# Altium schematic symbol library AD_Lib.SchLib: 1239 symbols (part 3 of 9)
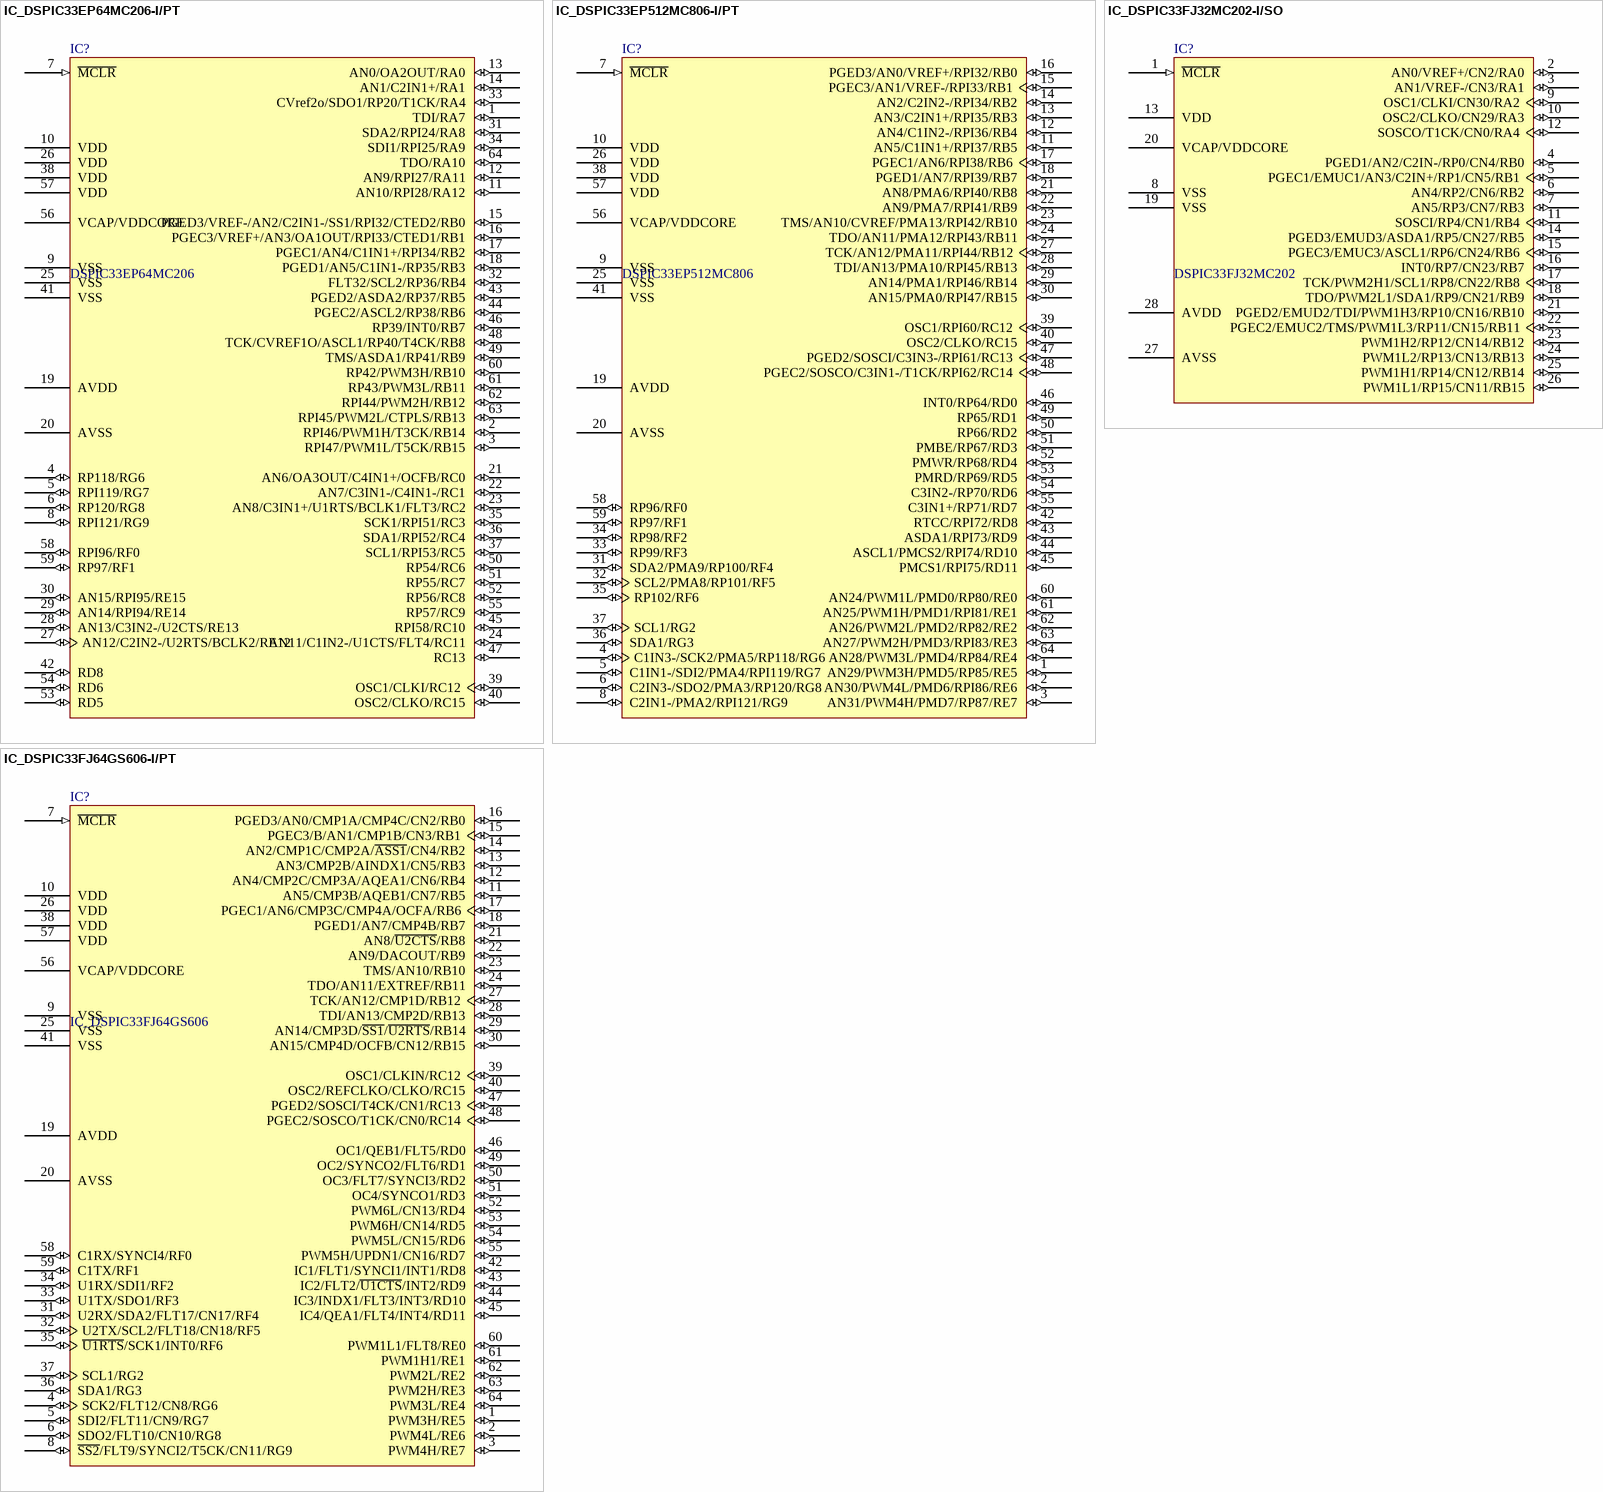
[diagram p44: symbols IC_DSPIC33EP64MC206-I/PT to IC_DSPIC33FJ64GS606-I/PT]

## IC_DSPIC33FJ64GS606-I/PT
designator IC?, comment IC_DSPIC33FJ64GS606
16bit MCU;40MHz;64 KB Flash, 9KB RAM; Manufacturer: Microchip; pro-environment: RoHS; Quality: -40~85¡æ; OPN: IC_DSPIC33FJ64GS606-I/PT; PadsNum: 0; SN: SN; Value: 16bit MCU;40MHz;64 KB Flash, 9 KB RAM; Category: ¼¯³ÉÐ¾Æ¬; Part: IC_DSPIC33FJ64GS606; QTY: 47; Price: ?; OPN_JLC: OPN_JLC; SN_JLC: SN_JLC; Price_JLC: 0
footprint TQFP-64 (Thin QFP, 64-Leads, Body 10x10mm, Pitch 0.5mm, IPC Low Density)
pins: 1 PWM3H/RE5 (io), 2 PWM4L/RE6 (io), 3 PWM4H/RE7 (io), 4 SCK2/FLT12/CN8/RG6 (io), 5 SDI2/FLT11/CN9/RG7 (io), 6 SDO2/FLT10/CN10/RG8 (io), 7 ~{MCLR} (in), 8 ~{SS2}/FLT9/SYNCI2/T5CK/CN11/RG9 (io), 9 VSS (power), 10 VDD (power), 11 AN5/CMP3B/AQEB1/CN7/RB5 (io), 12 AN4/CMP2C/CMP3A/AQEA1/CN6/RB4 (io), 13 AN3/CMP2B/AINDX1/CN5/RB3 (io), 14 AN2/CMP1C/CMP2A/~{ASS1}/CN4/RB2 (io), 15 PGEC3/B/AN1/CMP1B/CN3/RB1 (io), 16 PGED3/AN0/CMP1A/CMP4C/CN2/RB0 (io), 17 PGEC1/AN6/CMP3C/CMP4A/OCFA/RB6 (io), 18 PGED1/AN7/CMP4B/RB7 (io), 19 AVDD (power), 20 AVSS (power), 21 AN8/~{U2CTS}/RB8 (io), 22 AN9/DACOUT/RB9 (io), 23 TMS/AN10/RB10 (io), 24 TDO/AN11/EXTREF/RB11 (io), 25 VSS (power), 26 VDD (power), 27 TCK/AN12/CMP1D/RB12 (io), 28 TDI/AN13/CMP2D/RB13 (io), 29 AN14/CMP3D/~{SS1}/~{U2RTS}/RB14 (io), 30 AN15/CMP4D/OCFB/CN12/RB15 (io), 31 U2RX/SDA2/FLT17/CN17/RF4 (io), 32 U2TX/SCL2/FLT18/CN18/RF5 (io), 33 U1TX/SDO1/RF3 (io), 34 U1RX/SDI1/RF2 (io), 35 ~{U1RTS}/SCK1/INT0/RF6 (io), 36 SDA1/RG3 (io), 37 SCL1/RG2 (io), 38 VDD (power), 39 OSC1/CLKIN/RC12 (io), 40 OSC2/REFCLKO/CLKO/RC15 (io), 41 VSS (power), 42 IC1/FLT1/SYNCI1/INT1/RD8 (io), 43 IC2/FLT2/~{U1CTS}/INT2/RD9 (io), 44 IC3/INDX1/FLT3/INT3/RD10 (io), 45 IC4/QEA1/FLT4/INT4/RD11 (io), 46 OC1/QEB1/FLT5/RD0 (io), 47 PGED2/SOSCI/T4CK/CN1/RC13 (io), 48 PGEC2/SOSCO/T1CK/CN0/RC14 (io), 49 OC2/SYNCO2/FLT6/RD1 (io), 50 OC3/FLT7/SYNCI3/RD2 (io), 51 OC4/SYNCO1/RD3 (io), 52 PWM6L/CN13/RD4 (io), 53 PWM6H/CN14/RD5 (io), 54 PWM5L/CN15/RD6 (io), 55 PWM5H/UPDN1/CN16/RD7 (io), 56 VCAP/VDDCORE (power), 57 VDD (power), 58 C1RX/SYNCI4/RF0 (io), 59 C1TX/RF1 (io), 60 PWM1L1/FLT8/RE0 (io), 61 PWM1H1/RE1 (io), 62 PWM2L/RE2 (io), 63 PWM2H/RE3 (io), 64 PWM3L/RE4 (io)

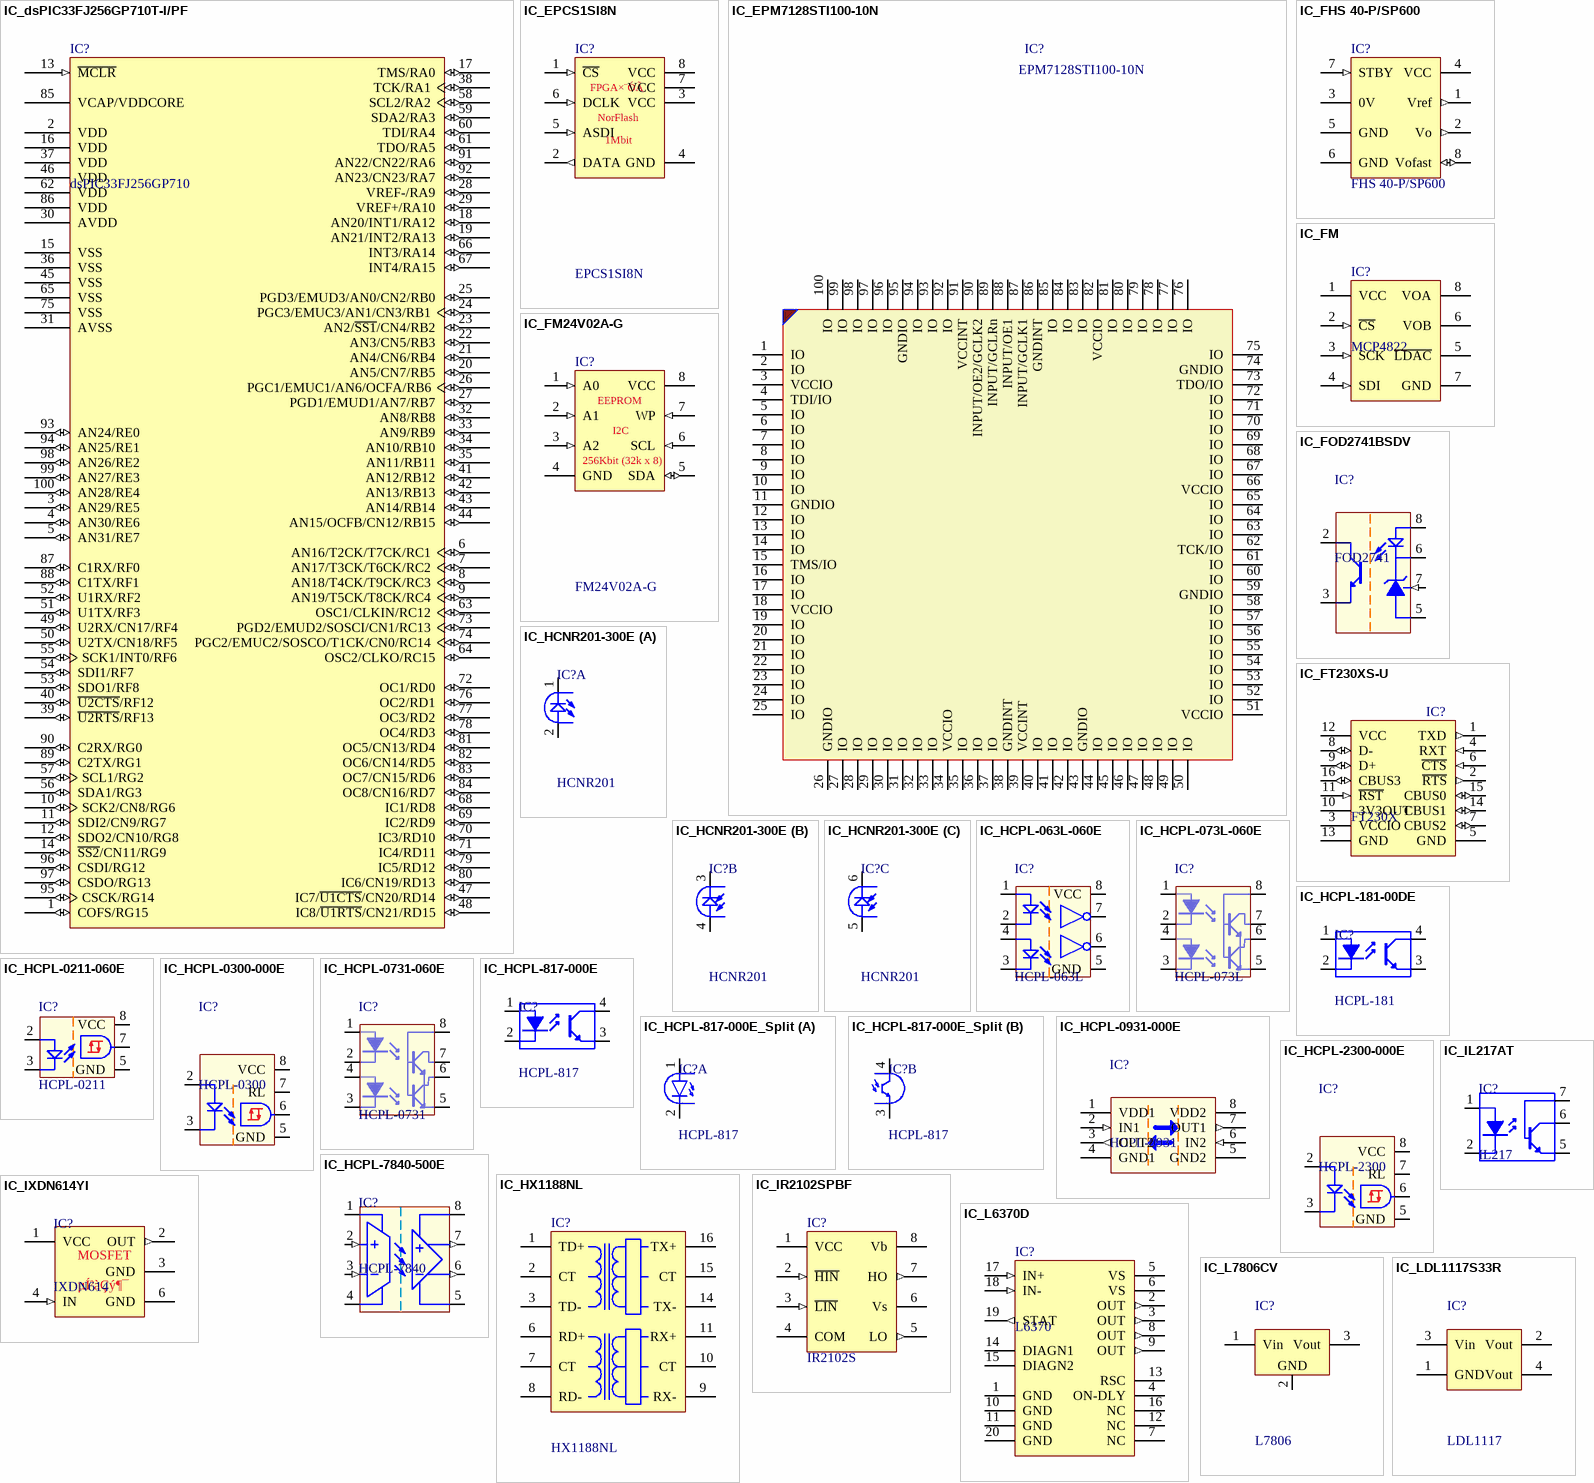
[diagram p10: symbols IC_dsPIC33FJ256GP710T-I/PF to IC_LDL1117S33R]

## IC_dsPIC33FJ256GP710T-I/PF
designator IC?, comment dsPIC33FJ256GP710
MCU,16bit,40MHz; Manufacturer: Microchip; Quality: -40~85¡æ; Value: 16bit;40MHz;3V~3.6V; pro-environment: RoHS; OPN: dsPIC33FJ256GP710-I/PF; PadsNum: 0; SN: SN; Category: ¼¯³ÉÐ¾Æ¬; Part: dsPIC33FJ256GP710; QTY: 90; Price: ?; OPN_JLC: OPN_JLC; SN_JLC: SN_JLC; Price_JLC: 0
footprint TQFP-100_W (100-Pin Thin Quad Flat Pack 0.5 mm Pitch, IPC Low Density)
pins: 1 COFS/RG15 (io), 2 VDD (power), 3 AN29/RE5 (io), 4 AN30/RE6 (io), 5 AN31/RE7 (io), 6 AN16/T2CK/T7CK/RC1 (io), 7 AN17/T3CK/T6CK/RC2 (io), 8 AN18/T4CK/T9CK/RC3 (io), 9 AN19/T5CK/T8CK/RC4 (io), 10 SCK2/CN8/RG6 (io), 11 SDI2/CN9/RG7 (io), 12 SDO2/CN10/RG8 (io), 13 ~{MCLR} (in), 14 ~{SS2}/CN11/RG9 (io), 15 VSS (power), 16 VDD (power), 17 TMS/RA0 (io), 18 AN20/INT1/RA12 (io), 19 AN21/INT2/RA13 (io), 20 AN5/CN7/RB5 (io), 21 AN4/CN6/RB4 (io), 22 AN3/CN5/RB3 (io), 23 AN2/~{SS1}/CN4/RB2 (io), 24 PGC3/EMUC3/AN1/CN3/RB1 (io), 25 PGD3/EMUD3/AN0/CN2/RB0 (io), 26 PGC1/EMUC1/AN6/OCFA/RB6 (io), 27 PGD1/EMUD1/AN7/RB7 (io), 28 VREF-/RA9 (io), 29 VREF+/RA10 (io), 30 AVDD (power), 31 AVSS (power), 32 AN8/RB8 (io), 33 AN9/RB9 (io), 34 AN10/RB10 (io), 35 AN11/RB11 (io), 36 VSS (power), 37 VDD (power), 38 TCK/RA1 (io), 39 ~{U2RTS}/RF13 (io), 40 ~{U2CTS}/RF12 (io), 41 AN12/RB12 (io), 42 AN13/RB13 (io), 43 AN14/RB14 (io), 44 AN15/OCFB/CN12/RB15 (io), 45 VSS (power), 46 VDD (power), 47 IC7/~{U1CTS}/CN20/RD14 (io), 48 IC8/~{U1RTS}/CN21/RD15 (io), 49 U2RX/CN17/RF4 (io), 50 U2TX/CN18/RF5 (io), 51 U1TX/RF3 (io), 52 U1RX/RF2 (io), 53 SDO1/RF8 (io), 54 SDI1/RF7 (io), 55 SCK1/INT0/RF6 (io), 56 SDA1/RG3 (io), 57 SCL1/RG2 (io), 58 SCL2/RA2 (io), 59 SDA2/RA3 (io), 60 TDI/RA4 (io), 61 TDO/RA5 (io), 62 VDD (power), 63 OSC1/CLKIN/RC12 (io), 64 OSC2/CLKO/RC15 (io), 65 VSS (power), 66 INT3/RA14 (io), 67 INT4/RA15 (io), 68 IC1/RD8 (io), 69 IC2/RD9 (io), 70 IC3/RD10 (io), 71 IC4/RD11 (io), 72 OC1/RD0 (io), 73 PGD2/EMUD2/SOSCI/CN1/RC13 (io), 74 PGC2/EMUC2/SOSCO/T1CK/CN0/RC14 (io), 75 VSS (power), 76 OC2/RD1 (io), 77 OC3/RD2 (io), 78 OC4/RD3 (io), 79 IC5/RD12 (io), 80 IC6/CN19/RD13 (io), 81 OC5/CN13/RD4 (io), 82 OC6/CN14/RD5 (io), 83 OC7/CN15/RD6 (io), 84 OC8/CN16/RD7 (io), 85 VCAP/VDDCORE (power), 86 VDD (power), 87 C1RX/RF0 (io), 88 C1TX/RF1 (io), 89 C2TX/RG1 (io), 90 C2RX/RG0 (io), 91 AN22/CN22/RA6 (io), 92 AN23/CN23/RA7 (io), 93 AN24/RE0 (io), 94 AN25/RE1 (io), 95 CSCK/RG14 (io), 96 CSDI/RG12 (io), 97 CSDO/RG13 (io), 98 AN26/RE2 (io), 99 AN27/RE3 (io), 100 AN28/RE4 (io)

## IC_EPCS1SI8N
designator IC?, comment EPCS1SI8N
NOR Flash,1Mb,FPGA×¨ÓÃ; Manufacturer: Altera; pro-environment: RoHS; Quality: -40~85¡æ; SN: 03.4.11.16.84S1SI01S; Value: 1Mb,3.3V; PadsNum: 0; Category: ¼¯³ÉÐ¾Æ¬; OPN: EPCS1SI8N; Part: EPCS1SI8N; QTY: 100; Price: 32; OPN_JLC: OPN_JLC; SN_JLC: SN_JLC; Price_JLC: 0
footprint SO-8 (SOIC, 8-Leads, Body 4.9x3.9mm, Pitch 1.27mm, IPC Low Density)
pins: 1 ~{CS} (in), 2 DATA (out), 3 VCC (power), 4 GND (power), 5 ASDI (in), 6 DCLK (in), 7 VCC (power), 8 VCC (power)
text: FPGA×¨ÓÃ; NorFlash; 1Mbit

## IC_EPM7128STI100-10N
designator IC?, comment EPM7128STI100-10N
CPLD,3~3.6V; Manufacturer: Altera; Other: CPLD;3~3.6V;84 I/O;8 LAB; pro-environment: RoHS; Quality: -40~85¡æ; Value: 20MHz,3.3V; SN: 03.4.11.27.71712801S; PadsNum: 0; OPN: EPM7128STI100-10N; Part: EPM7128STI100-10N; QTY: 90; Price: 534.5613; OPN_JLC: OPN_JLC; SN_JLC: SN_JLC; Price_JLC: 0
footprint TQFP-100_W (100-Pin Thin Quad Flat Pack 0.5 mm Pitch, IPC Low Density)
pins: 1 IO, 2 IO, 3 VCCIO, 4 TDI/IO, 5 IO, 6 IO, 7 IO, 8 IO, 9 IO, 10 IO, 11 GNDIO, 12 IO, 13 IO, 14 IO, 15 TMS/IO, 16 IO, 17 IO, 18 VCCIO, 19 IO, 20 IO, 21 IO, 22 IO, 23 IO, 24 IO, 25 IO, 26 GNDIO, 27 IO, 28 IO, 29 IO, 30 IO, 31 IO, 32 IO, 33 IO, 34 VCCIO, 35 IO, 36 IO, 37 IO, 38 GNDINT, 39 VCCINT, 40 IO, 41 IO, 42 IO, 43 GNDIO, 44 IO, 45 IO, 46 IO, 47 IO, 48 IO, 49 IO, 50 IO, 51 VCCIO, 52 IO, 53 IO, 54 IO, 55 IO, 56 IO, 57 IO, 58 IO, 59 GNDIO, 60 IO, 61 IO, 62 TCK/IO, 63 IO, 64 IO, 65 IO, 66 VCCIO, 67 IO, 68 IO, 69 IO, 70 IO, 71 IO, 72 IO, 73 TDO/IO, 74 GNDIO, 75 IO, 76 IO, 77 IO, 78 IO, 79 IO, 80 IO, 81 IO, 82 VCCIO, 83 IO, 84 IO, 85 IO, 86 GNDINT, 87 INPUT/GCLK1, 88 INPUT/OE1, 89 INPUT/GCLRn, 90 INPUT/OE2/GCLK2, 91 VCCINT, 92 IO, 93 IO, 94 IO, 95 GNDIO, 96 IO, 97 IO, 98 IO, 99 IO, 100 IO

## IC_FHS 40-P/SP600
designator IC?, comment FHS 40-P/SP600
µçÁ÷´«¸ÐÆ÷; 0-100A; 5V; Manufacturer: LEM; Quality: -40~125¡æ; Value: 100A,5V; pro-environment: RoHS; SN: 03.4.11.22.83FHS401S; other: 200mV/A; PadsNum: 0; Category: ¼¯³ÉÐ¾Æ¬; OPN: FHS 40-P/SP600; Part: FHS 40-P/SP600; QTY: 75; Price: ?; OPN_JLC: OPN_JLC; SN_JLC: SN_JLC; Price_JLC: 0
footprint SO-8 (SOIC, 8-Leads, Body 4.9x3.9mm, Pitch 1.27mm, IPC Low Density)
pins: 1 Vref (out), 2 Vo (out), 3 0V, 4 VCC (power), 5 GND (power), 6 GND (power), 7 STBY (in), 8 Vofast (io)

## IC_FM
designator IC?, comment MCP4822
DAC; SPI; 12bit; 2Í¨µÀ; 2.7V~5.5V; Manufacturer: Microchip; pro-environment: RoHS; Quality: -40~125¡æ; OPN: MCP4822-E/SN; other: ÄÚ²¿²Î¿¼Ô´; PadsNum: 8; SN: SN; Category: ¼¯³ÉÐ¾Æ¬; Part: MCP4822; QTY: 100; Price: 18.3738; OPN_JLC: MCP4822-E/SN; SN_JLC: C16040; Price_JLC: 11.11
footprint SO-8 (SOIC, 8-Leads, Body 4.9x3.9mm, Pitch 1.27mm, IPC Low Density)
pins: 1 VCC (power), 2 ~{CS} (in), 3 SCK (in), 4 SDI (in), 5 ~{LDAC}, 6 VOB, 7 GND (power), 8 VOA

## IC_FM24V02A-G
designator IC?, comment FM24V02A-G
256Kbit (32kx8) EEPROM, F-RAM;2.0~3.6V;I2C; Manufacturer: Cypress; pro-environment: RoHS; Quality: -40~85°C; PadsNum: 0; SN: SN; Value: 2.0~3.6V; Category: F-RAM; OPN: FM24V02A-G; Part: FM24V02A-G; other: 256Kbit (32kx8) EEPROM, F-RAM;2.0~3.6V;I2C; OPN_JLC: OPN_JLC; SN_JLC: SN_JLC; Price_JLC: 0
footprint SO-8 (SOIC, 8-Leads, Body 4.9x3.9mm, Pitch 1.27mm, IPC Low Density)
pins: 1 A0 (in), 2 A1 (in), 3 A2 (in), 4 GND (power), 5 SDA (io), 6 SCL (in), 7 WP (in), 8 VCC (power)
text: EEPROM; I2C; 256Kbit (32k x 8)

## IC_FOD2741BSDV
designator IC?, comment FOD2741
¹âñî;Vce=30V;If=20mA; Manufacturer: ON; Quality: -40~85¡æ; pro-environment: RoHS; Value: Vce=30V;If=20mA;5kV; OPN: FOD2741BSDV; PadsNum: 0; SN: SN; Category: ¼¯³ÉÐ¾Æ¬; Part: FOD2741; QTY: 1000; Price: 4.914; OPN_JLC: OPN_JLC; SN_JLC: SN_JLC; Price_JLC: 0
footprint DIP-8 (DIP; 8 Leads; Row Spacing 7.62 mm; Pitch 2.54 mm)
pins: 2 C, 3 E, 5 GND (power), 6 COMP (oc), 7 FB (in), 8 LED

## IC_FT230XS-U
designator IC?, comment FT230X
USB<->UART;2.97~5.5V;12Mb/s; Manufacturer: FTDI; Value: 2.97V~5.5V,12Mb/s; Quality: -40~125¡æ; pro-environment: RoHS; OPN: FT230XS-U; PadsNum: 0; other: USB<->UART;2.97~5.5V;12Mb/s; SN: SN; Category: ¼¯³ÉÐ¾Æ¬; Part: FT230X; QTY: 100; Price: 14.9872; OPN_JLC: OPN_JLC; SN_JLC: SN_JLC; Price_JLC: 0
footprint IC_FT23XS-U (SOP, 16-Leads, Body 4.90x3.91mm, Pitch 0.635mm)
pins: 1 TXD (out), 2 ~{RTS} (out), 3 VCCIO (power), 4 RXT (in), 5 GND (power), 6 ~{CTS} (in), 7 CBUS2 (io), 8 D- (io), 9 D+ (io), 10 3V3OUT (power), 11 ~{RST} (in), 12 VCC (power), 13 GND (power), 14 CBUS1 (io), 15 CBUS0 (io), 16 CBUS3 (io)

## IC_HCNR201-300E
designator IC?, comment HCNR201
ÏßÐÔ¹âñî; Manufacturer: Avago; pro-environment: RoHS; Quality: -55~100¡æ; SN: 03.4.23.11.47R20101S; Value: ¡À5%; OPN: HCNR201-300E; other: 1-20mA;5%; PadsNum: 0; Category: ¼¯³ÉÐ¾Æ¬; Part: HCNR201; QTY: 42; Price: ?; OPN_JLC: OPN_JLC; SN_JLC: SN_JLC; Price_JLC: 0
footprint DIP8_SMD (ÌùÆ¬¸ßËÙ¹âñî£¨ÈçHCPL-2300£©)
part A pins: 1, 2
part B pins: 3, 4
part C pins: 5, 6

## IC_HCPL-063L-060E
designator IC?, comment HCPL-063L
¹âñî£¬¸ßËÙ£¬µÍµ¼Í¨µçÁ÷; Manufacturer: Avago; pro-environment: RoHS; Quality: -40~85¡æ; Value: 10Mbps; OPN: HCPL-063L-060E; other: If=5mA;VDD=3.3/5V; PadsNum: 0; SN: SN; Category: ¼¯³ÉÐ¾Æ¬; Part: HCPL-063L; QTY: 100; Price: ?; OPN_JLC: OPN_JLC; SN_JLC: SN_JLC; Price_JLC: 0
footprint SO-8 (SOIC, 8-Leads, Body 4.9x3.9mm, Pitch 1.27mm, IPC Low Density)
pins: 1 A1, 2 C1, 3 C2, 4 A2, 5 GND (power), 6 Vo2, 7 Vo1, 8 VCC (power)

## IC_HCPL-073L-060E
designator IC?, comment HCPL-073L
¹âñî;100 kbps;0.5mA; Manufacturer: Avago; pro-environment: RoHS; Quality: 0~70¡æ; SN: 03.4.23.11.83073L01S; OPN: HCPL-073L-060E; other: If=0.5mA;VDD=3.3V/5V; PadsNum: 0; Value: 100 kbps; Category: ¼¯³ÉÐ¾Æ¬; Part: HCPL-073L; QTY: 100; Price: 22.5693; OPN_JLC: OPN_JLC; SN_JLC: SN_JLC; Price_JLC: 0
footprint SO-8 (SOIC, 8-Leads, Body 4.9x3.9mm, Pitch 1.27mm, IPC Low Density)
pins: 1 A "Anode", 2 K "Cathode", 3 K "Cathode", 4 A "Anode", 5 E "Emitter", 6 C2 "Emitter", 7 C1 "Collector", 8 VCC "Collector"

## IC_HCPL-181-00DE
designator IC?, comment HCPL-181
¹âñî; 80V; 50mA; 18us/18us; Manufacturer: Avago; pro-environment: RoHS; Quality: -55~100¡æ; SN: 03.4.23.11.47L18101S; Value: 25kbps; OPN: HCPL-181-00DE; PadsNum: 0; Category: ¼¯³ÉÐ¾Æ¬; Part: HCPL-181; QTY: 3000; Price: 1.2753; OPN_JLC: OPN_JLC; SN_JLC: SN_JLC; Price_JLC: 0
footprint SO-4W (Pitch=100mil£¬ÈçHCPL-181)
pins: 1 A "Anode", 2 K "Cathode", 3 E "Emitter", 4 C "Collector"

## IC_HCPL-0211-060E
designator IC?, comment HCPL-0211
¹âñî£¬¸ßËÙ; Manufacturer: Avago; Quality: -40~80¡æ; pro-environment: RoHS; Value: 5 Mbps; OPN: HCPL-0211-060E; PadsNum: 0; SN: SN; Category: ¼¯³ÉÐ¾Æ¬; Part: HCPL-0211; QTY: 100; Price: ?; OPN_JLC: OPN_JLC; SN_JLC: SN_JLC; Price_JLC: 0
footprint SO-8 (SOIC, 8-Leads, Body 4.9x3.9mm, Pitch 1.27mm, IPC Low Density)
pins: 2 A, 3 C, 5 GND (power), 7 Vo1, 8 VCC (power)

## IC_HCPL-0300-000E
designator IC?, comment HCPL-0300
¹âñî;5Mbps; Manufacturer: Avago; Quality: -40~80¡æ; pro-environment: RoHS; OPN: HCPL-0300-000E; PadsNum: 0; Value: 5 Mbps; SN: SN; Category: ¼¯³ÉÐ¾Æ¬; Part: HCPL-0300; QTY: 50; Price: 37.3464; OPN_JLC: OPN_JLC; SN_JLC: SN_JLC; Price_JLC: 0
footprint SO-8 (SOIC, 8-Leads, Body 4.9x3.9mm, Pitch 1.27mm, IPC Low Density)
pins: 2 A, 3 C, 5 GND (power), 6  Vout (oc), 7 RL, 8 VCC (power)

## IC_HCPL-0731-060E
designator IC?, comment HCPL-0731
¹âñî;100kbps;0.5mA; Manufacturer: Avago; pro-environment: RoHS; Quality: 0~70¡æ; SN: 03.4.23.11.47073101S; OPN: HCPL-0731-060E; other: If=0.5mA;VDD=5V; PadsNum: 0; Value: 100 kbps; Category: ¼¯³ÉÐ¾Æ¬; Part: HCPL-0731; QTY: 100; Price: ?; OPN_JLC: OPN_JLC; SN_JLC: SN_JLC; Price_JLC: 0
footprint SO-8 (SOIC, 8-Leads, Body 4.9x3.9mm, Pitch 1.27mm, IPC Low Density)
pins: 1 A "Anode", 2 K "Cathode", 3 K "Cathode", 4 A "Anode", 5 E "Emitter", 6 C2 "Emitter", 7 C1 "Collector", 8 VCC "Collector"

## IC_HCPL-817-000E
designator IC?, comment HCPL-817
¹âñî; Manufacturer: Avago; pro-environment: RoHS; Quality: -30~100¡æ; Value: 25kbps; OPN: HCPL-817-000E; PadsNum: 0; SN: SN; Category: ¼¯³ÉÐ¾Æ¬; Part: HCPL-817; QTY: 100; Price: 1.521; OPN_JLC: OPN_JLC; SN_JLC: SN_JLC; Price_JLC: 0
footprint DIP-4 (DIP; 4 Leads; Row Spacing 7.62 mm; Pitch 2.54 mm)
pins: 1 A "Anode", 2 K "Cathode", 3 E "Emitter", 4 C "Collector"

## IC_HCPL-817-000E_Split
designator IC?, comment HCPL-817
¹âñî; ·ÖÀëÐÍ; Manufacturer: Avago; pro-environment: RoHS; Quality: -30~100¡æ; Value: 25kbps; OPN: HCPL-817-000E; PadsNum: 0; SN: SN; Category: ¼¯³ÉÐ¾Æ¬; Part: HCPL-817; QTY: 100; Price: 1.521; OPN_JLC: OPN_JLC; SN_JLC: SN_JLC; Price_JLC: 0
footprint DIP-4 (DIP; 4 Leads; Row Spacing 7.62 mm; Pitch 2.54 mm)
part A pins: 1 A "Anode", 2 K "Cathode"
part B pins: 3 E "Emitter", 4 C "Collector"

## IC_HCPL-0931-000E
designator IC?, comment HCPL-0931
Êý×Ö¸ôÀëÆ÷,1In1Out,2.7~5.5V; Manufacturer: Avago; Quality: -40~80¡æ; pro-environment: RoHS; Value: 100MBd; SN: 03.4.23.11.83093101S; OPN: HCPL-0931-000E; PadsNum: 0; Category: ¼¯³ÉÐ¾Æ¬; Part: HCPL-0931; QTY: 100; Price: 34.2693; OPN_JLC: OPN_JLC; SN_JLC: SN_JLC; Price_JLC: 0
footprint SO-8 (SOIC, 8-Leads, Body 4.9x3.9mm, Pitch 1.27mm, IPC Low Density)
pins: 1 VDD1 (power), 2 IN1 (in), 3 OUT2 (out), 4 GND1, 5 GND2 (power), 6 IN2 (in), 7 OUT1 (out), 8 VDD2 (power)

## IC_HCPL-2300-000E
designator IC?, comment HCPL-2300
¹âñî;5Mbps; Manufacturer: Avago; Quality: -40~80¡æ; pro-environment: RoHS; SN: 03.4.23.11.83230001S; OPN: HCPL-2300-000E; PadsNum: 0; Value: 5 Mbps; Category: ¼¯³ÉÐ¾Æ¬; Part: HCPL-2300; QTY: 50; Price: 37.3464; OPN_JLC: OPN_JLC; SN_JLC: SN_JLC; Price_JLC: 0
footprint DIP-8 (DIP; 8 Leads; Row Spacing 7.62 mm; Pitch 2.54 mm)
pins: 2 A, 3 C, 5 GND (power), 6  Vout (oc), 7 RL, 8 VCC (power)

## IC_HCPL-7840-500E
designator IC?, comment HCPL-7840
¸ôÀëÔË·Å£¬BW=100kHz; Manufacturer: Avago; pro-environment: RoHS; Quality: -30~100¡æ; SN: 03.4.23.11.47784001S; OPN: HCPL-7840-500E; other: 4.5V~5.5V;Gain=8 V/V; PadsNum: 0; Value: BW=100kHz; Category: ¼¯³ÉÐ¾Æ¬; Part: HCPL-7840; QTY: 1000; Price: 26.9568; OPN_JLC: OPN_JLC; SN_JLC: SN_JLC; Price_JLC: 0
footprint DIP8_SMD (ÌùÆ¬¸ßËÙ¹âñî£¨ÈçHCPL-2300£©)
pins: 1 VDD1 (power), 2 + (in), 3 - (in), 4 GND1 (power), 5 GND2 (power), 6 - (out), 7 + (out), 8 VDD2

## IC_HX1188NL
designator IC?, comment HX1188NL
ÒÔÌ«Íø¸ôÀë±äÑ¹Æ÷; Manufacturer: Pulse; pro-environment: RoHS; Quality: -40~85¡æ; SN: 03.4.11.25.47118801S; Value: 10kHz~100MHz; other: 1.5kV,10kHz~100MHz; PadsNum: 0; Category: ¼¯³ÉÐ¾Æ¬; OPN: HX1188NL; Part: HX1188NL; QTY: 40; Price: ?; OPN_JLC: OPN_JLC; SN_JLC: SN_JLC; Price_JLC: 0
footprint HX1188NL (SOP, 16-Leads, Body 12.7x7.1mm (max), Pitch 1.2)
pins: 1 TD+, 2 CT, 3 TD-, 6 RD+, 7 CT, 8 RD-, 9 RX-, 10 CT, 11 RX+, 14 TX-, 15 CT, 16 TX+

## IC_IL217AT
designator IC?, comment IL217
¹âñî; Manufacturer: Vishay; pro-environment: RoHS; Quality: -55~100¡æ; Value: 3us/3us; OPN: IL217AT; PadsNum: 0; SN: SN; Category: ¼¯³ÉÐ¾Æ¬; Part: IL217; QTY: 2000; Price: 2.6091; OPN_JLC: OPN_JLC; SN_JLC: SN_JLC; Price_JLC: 0
footprint SO-8 (SOIC, 8-Leads, Body 4.9x3.9mm, Pitch 1.27mm, IPC Low Density)
pins: 1 A "Anode", 2 K "Cathode", 5 E "Emitter", 6 C "Collector", 7 B "Collector"

## IC_IR2102SPBF
designator IC?, comment IR2102S
MOSFETÇý¶¯; Manufacturer: IR; Quality: -40~125¡æ; Value: 130mA,10~20V; pro-environment: RoHS; SN: 03.4.11.20.84210201S; OPN: IR2102SPBF; PadsNum: 0; Category: ¼¯³ÉÐ¾Æ¬; Part: IR2102S; QTY: 95; Price: ?; OPN_JLC: OPN_JLC; SN_JLC: SN_JLC; Price_JLC: 0
footprint SO-8 (SOIC, 8-Leads, Body 4.9x3.9mm, Pitch 1.27mm, IPC Low Density)
pins: 1 VCC (power), 2 ~{HIN} (in), 3 ~{LIN} (in), 4 COM (power), 5 LO (out), 6 Vs, 7 HO (out), 8 Vb (power)

## IC_IXDN614YI
designator IC?, comment IXDN614
MOSFETÇý¶¯;1CH;4.5~35V;µÍ²à; Manufacturer: IXYS; pro-environment: RoHS; Quality: -40~80¡æ; SN: 03.4.24.21.63N61401S; OPN: IXDN614YI; Value: 4.5~35V;Low-Side; PadsNum: 0; part: IXDN614; QTY: 50; Price: 34.281; Category: ¼¯³ÉÐ¾Æ¬; OPN_JLC: OPN_JLC; SN_JLC: SN_JLC; Price_JLC: 0
footprint SO-8 (SOIC, 8-Leads, Body 4.9x3.9mm, Pitch 1.27mm, IPC Low Density)
pins: 1 VCC (power), 2 OUT (out), 3 GND (power), 4 IN (in), 6 GND (power)
text: MOSFET; µÍ²àÇý¶¯

## IC_L6370D
designator IC?, comment L6370
IPS,HS,4CH,2.5A,9.5~35V; Manufacturer: ST; pro-environment: RoHS; Quality: -25~85¡æ; SN: 03.4.11.20.84L67301S; OPN: L6370D; PadsNum: 0; Value: 2.5A,9.5~35V; Category: ¼¯³ÉÐ¾Æ¬; Part: L6370; QTY: 31; Price: 47.8647; OPN_JLC: OPN_JLC; SN_JLC: SN_JLC; Price_JLC: 0
footprint PowerSO-20 (20-Pin Small Outline Package 1.27 mm Pitch, IPC High Density)
pins: 1 GND (power), 2 OUT (out), 3 OUT (out), 4 ON-DLY, 5 VS (power), 6 VS (power), 7 NC, 8 OUT (out), 9 OUT (out), 10 GND (power), 11 GND (power), 12 NC, 13 RSC, 14 DIAGN1 (oc), 15 DIAGN2 (oc), 16 NC, 17 IN+ (in), 18 IN- (in), 19 STAT (out), 20 GND (power)

## IC_L7806CV
designator IC?, comment L7806
ÎÈÑ¹Ð¾Æ¬; LDO; 35V; 6V/1.5A; Manufacturer: ST; pro-environment: RoHS; Quality: 0~125¡æ; Value: 6V,1.5A; OPN: L7806CV; PadsNum: 3; SN: SN; Category: ¼¯³ÉÐ¾Æ¬; Part: L7806; QTY: 50; Price: 4.1019; OPN_JLC: L7806CV; SN_JLC: C181037; Price_JLC: 1.1859
footprint TO220-3 (TO, Thru-Hole, Vertical, Heatsink Mounted; 3 In-Line Leads; Pitch 2.54 mm)
pins: 0 GND (power), 1 Vin, 2 GND (power), 3 Vout

## IC_LDL1117S33R
designator IC?, comment LDL1117
LDO; 1.2A; 0.35V@1.2A; 87dB@120Hz; Manufacturer: ST; pro-environment: RoHS; Quality: -40~125¡æ; Value: 3.3V,1.2A; OPN: LDL1117S33R; PadsNum: 4; SN: SN; Category: ¼¯³ÉÐ¾Æ¬; Part: LDL1117; QTY: 2500; Price: 2.1809; OPN_JLC: LDL1117S33R; SN_JLC: C435835; Price_JLC: 1.1177
footprint SOT223-4 (SOT223, 4-Leads, Body 6.5x3.5mm, Pitch 2.3mm, Lead Span 7mm, IPC Low Density)
pins: 1 GND, 2 Vout, 3 Vin, 4 Vout

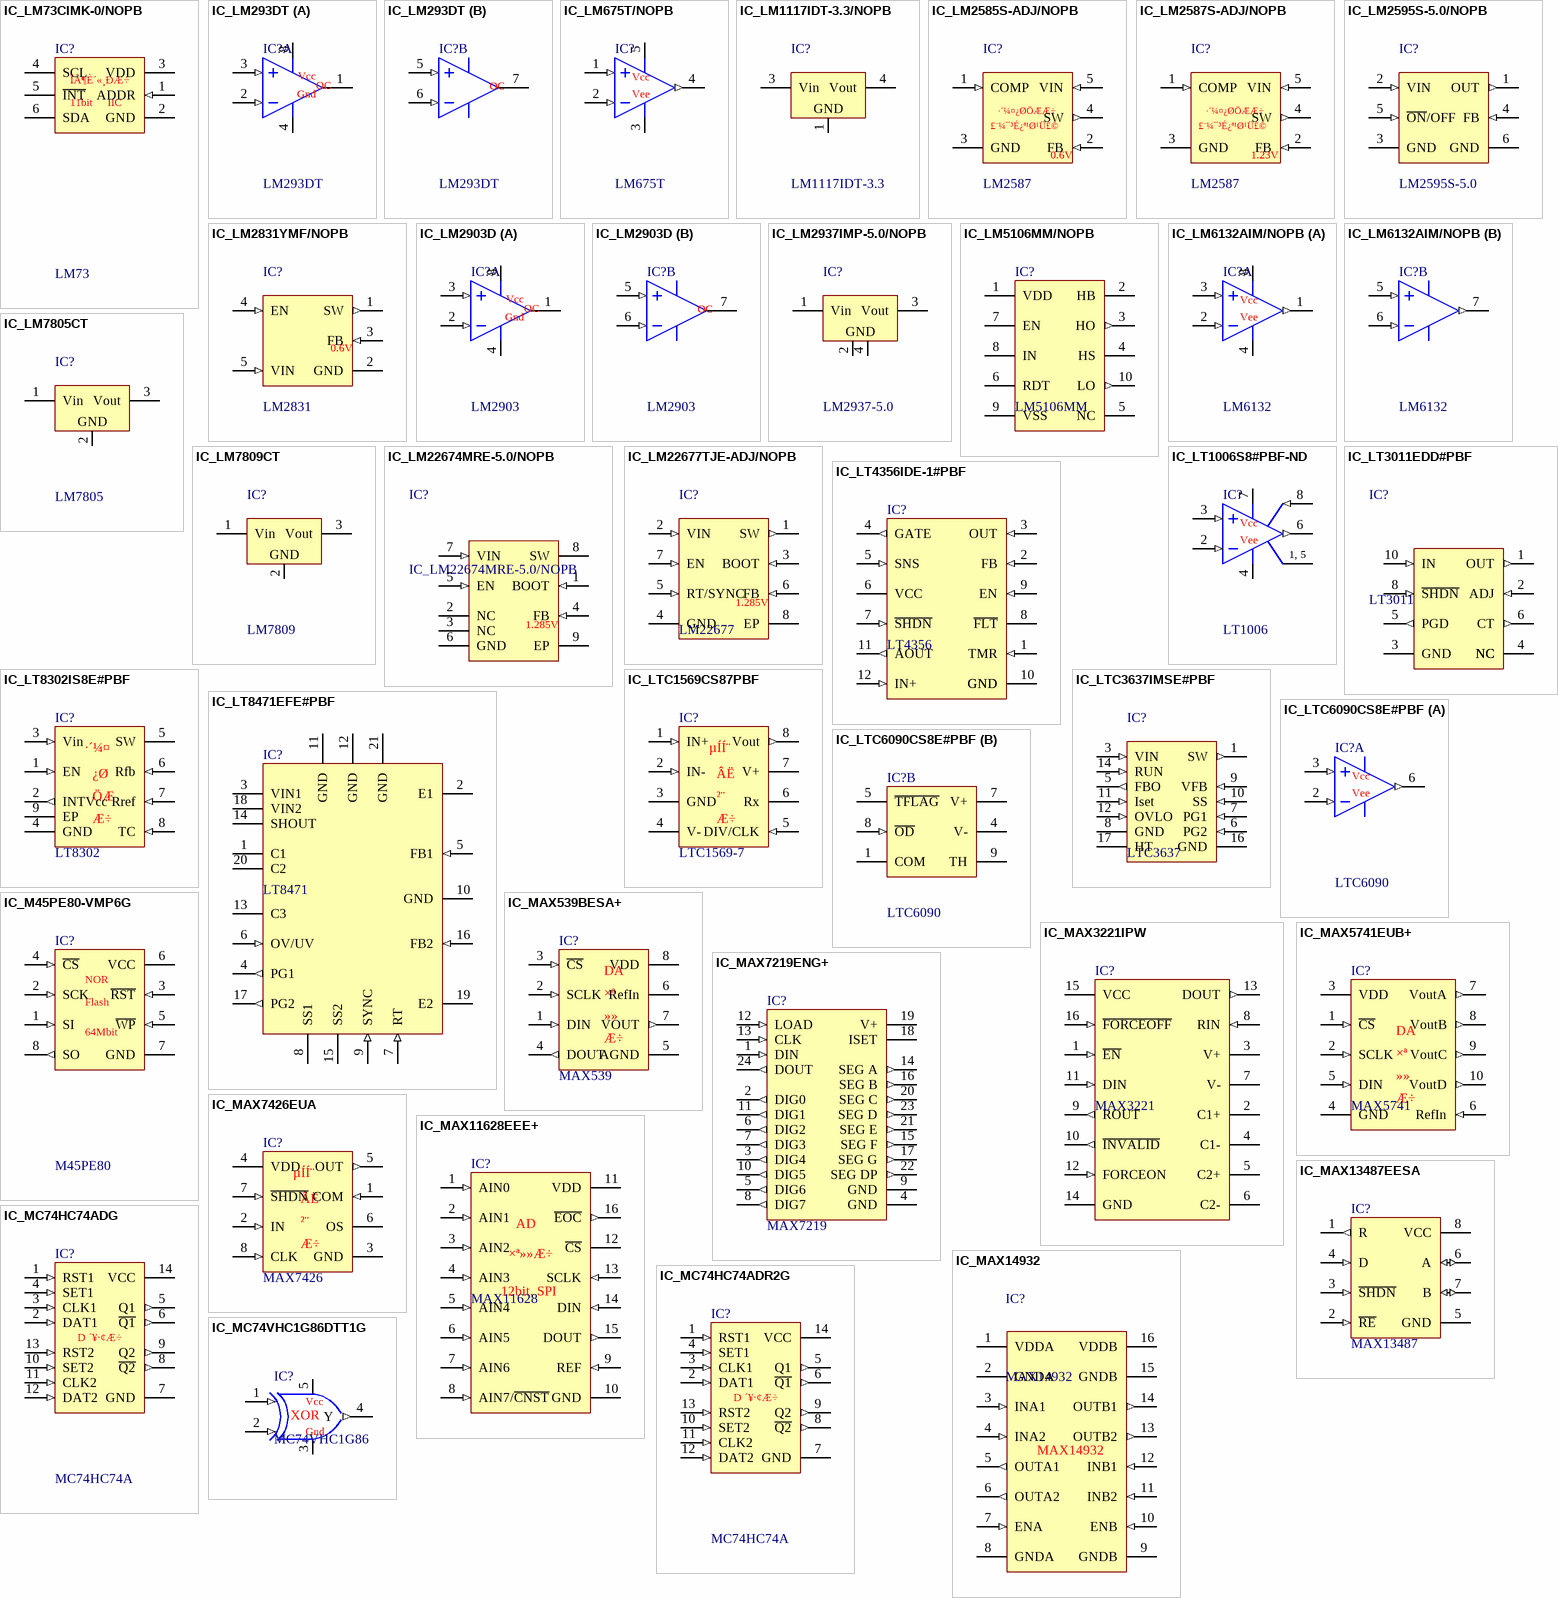
[diagram p11: symbols IC_LM73CIMK-0/NOPB to IC_MC74VHC1G86DTT1G]

## IC_LM73CIMK-0/NOPB
designator IC?, comment LM73
ÎÂ¶È´«¸ÐÆ÷; 11~14bit; 2.7~5.5V; I2C;¡À2C; Manufacturer: TI; pro-environment: RoHS; Quality: -40~150¡æ; Value: 11~14bit,2.7~5.5V,IIC; OPN: LM73CIMK-0/NOPB; other: ÎÂ¶È´«¸ÐÆ÷; 11~14bit; 2.7~5.5V; I2C;;¡À2C; PadsNum: 0; SN: SN; Category: ¼¯³ÉÐ¾Æ¬; Part: LM73; QTY: 1000; Price: 7.8068; OPN_JLC: OPN_JLC; SN_JLC: SN_JLC; Price_JLC: 0
footprint SOT23-6 (SOT23, 6-Leads, Body 2.9x1.6mm, Pitch 0.95mm, Lead Span 2.7mm, IPC Low Density)
pins: 1 ADDR (in), 2 GND (power), 3 VDD (power), 4 SCL (oc), 5 ~{INT} (oc), 6 SDA (oc)
text: ÎÂ¶È´«¸ÐÆ÷; 11bit; IIC

## IC_LM293DT
designator IC?, comment LM293DT
±È½ÏÆ÷; 2P; Io=4mA; Manufacturer: ST; Quality: -40~105¡æ; Value: 2V~36V;; pro-environment: RoHS; SN: 03.4.11.15.83M29301S; other: Io=4mA;Êä³ö¼¶=OC; PadsNum: 0; Category: ¼¯³ÉÐ¾Æ¬; OPN: LM293DT; Part: LM293DT; QTY: 2500; Price: 0.73944; OPN_JLC: OPN_JLC; SN_JLC: SN_JLC; Price_JLC: 0
footprint SO-8 (SOIC, 8-Leads, Body 4.9x3.9mm, Pitch 1.27mm, IPC Low Density)
part A pins: 1 OUT (oc), 2 IN- (in), 3 IN+ (in), 4 GND (power), 8 VCC (power)
part B pins: 5 IN+ (in), 6 IN- (in), 7 OUT (oc)
part A text: Vcc; OC; Gnd
part B text: OC

## IC_LM675T/NOPB
designator IC?, comment LM675T
¹¦ÂÊÔË·Å; Io=3A; 16~60V; Manufacturer: TI; Quality: -40~85¡æ; Value: 3A;16V~60V;; pro-environment: RoHS; other: Io=3A;SR=8V/us; OPN: LM675T/NOPB; PadsNum: 0; SN: SN; Category: ¼¯³ÉÐ¾Æ¬; Part: LM675T; QTY: 45; Price: 41.2074; OPN_JLC: OPN_JLC; SN_JLC: SN_JLC; Price_JLC: 0
footprint TO220-5B_HT (TO, Thru-Hole, Vertical, Heatsink Mounted; 5 Bent Staggered Leads; Pitch 1.7 mm)
pins: 1 IN+ (in), 2 IN- (in), 3 VEE (power), 4 OUTA (out), 5 VCC (power)
text: Vcc; Vee

## IC_LM1117IDT-3.3/NOPB
designator IC?, comment LM1117IDT-3.3
ÎÈÑ¹Ð¾Æ¬,LDO,3.3V/1.5A; Manufacturer: TI; pro-environment: RoHS; Quality: -40~125¡æ; Value: 3.3V,1.5A; OPN: LM1117IDT-3.3/NOPB; PadsNum: 0; SN: SN; Category: ¼¯³ÉÐ¾Æ¬; Part: LM1117IDT-3.3; QTY: 75; Price: 8.1666; OPN_JLC: OPN_JLC; SN_JLC: SN_JLC; Price_JLC: 0
footprint TO252-3 (D-PAK, 4-Leads, Body 6.1x6.5mm, Pitch 2.28mm, Lead Span 9.8mm, IPC Low Density)
pins: 1 GND (power), 3 Vin, 4 Vout

## IC_LM2585S-ADJ/NOPB
designator IC?, comment LM2587
ÎÈÑ¹Ð¾Æ¬; ¿ª¹ØÐÍ; Êä³öµçÁ÷3A; Manufacturer: TI; pro-environment: RoHS; Quality: -40~125¡æ; Value: ADJ,3A; OPN: LM2587S-ADJ/NOPB; other: Vin=4V~40V,Vout>=1.23 V;Iout=3A; PadsNum: 0; SN: SN; Category: ¼¯³ÉÐ¾Æ¬; Part: LM2587; QTY: 45; Price: 72.9144; OPN_JLC: OPN_JLC; SN_JLC: SN_JLC; Price_JLC: 0
footprint TO263-5 (LM2576ÏµÁÐÌùÆ¬Ôª¼þ£¬NSÄÚ²¿±àºÅTS5B)
pins: 1 COMP (in), 2 FB (in), 3 GND (power), 4 SW (out), 5 VIN (in)
text: ·´¼¤¿ØÖÆÆ÷; £¨¼¯³É¿ª¹Ø¹Ü£©; 0.6V

## IC_LM2587S-ADJ/NOPB
designator IC?, comment LM2587
ÎÈÑ¹Ð¾Æ¬; ¿ª¹ØÐÍ; Êä³öµçÁ÷5A; Manufacturer: TI; pro-environment: RoHS; Quality: -40~125¡æ; SN: 03.4.11.13.63258701S; Value: ADJ,5A; OPN: LM2587S-ADJ/NOPB; other: Vin=4V~40V,Vout>=1.23 V;Iout=5A; PadsNum: 0; Category: ¼¯³ÉÐ¾Æ¬; Part: LM2587; QTY: 45; Price: 72.9144; OPN_JLC: OPN_JLC; SN_JLC: SN_JLC; Price_JLC: 0
footprint TO263-5 (LM2576ÏµÁÐÌùÆ¬Ôª¼þ£¬NSÄÚ²¿±àºÅTS5B)
pins: 1 COMP (in), 2 FB (in), 3 GND (power), 4 SW (out), 5 VIN (in), 6 PAD (power)
text: ·´¼¤¿ØÖÆÆ÷; £¨¼¯³É¿ª¹Ø¹Ü£©; 1.23V

## IC_LM2595S-5.0/NOPB
designator IC?, comment LM2595S-5.0
ÎÈÑ¹Ð¾Æ¬; ¿ª¹ØÐÍ; 4.5V~40V,5 V/1A; Manufacturer: TI; pro-environment: RoHS; Quality: -40~85¡æ; SN: 03.4.11.13.63259501S; Value: 40V,1A; OPN: LM2595S-5.0/NOPB; other: Vin=4.5V~40V,Vout=5 V;Iout=1A; PadsNum: 0; Category: ¼¯³ÉÐ¾Æ¬; Part: LM2595S-5.0; QTY: 45; Price: 31.0401; OPN_JLC: OPN_JLC; SN_JLC: SN_JLC; Price_JLC: 0
footprint TO263-5 (LM2576ÏµÁÐÌùÆ¬Ôª¼þ£¬NSÄÚ²¿±àºÅTS5B)
pins: 1 OUT (out), 2 VIN (in), 3 GND (power), 4 FB (in), 5 ~{ON}/OFF (in), 6 GND (power)

## IC_LM2831YMF/NOPB
designator IC?, comment LM2831
ÎÈÑ¹Ð¾Æ¬; ¿ª¹ØÐÍ; Êä³öµçÁ÷1.5A; Manufacturer: TI; pro-environment: RoHS; Quality: -40~125¡æ; SN: 03.4.11.13.49283101S; Value: 5V,1.5A; OPN: LM2831YMF/NOPB; other: Vin=3.3V~5V,Vout>=0.6 V;Iout=1.5A; PadsNum: 0; Category: ¼¯³ÉÐ¾Æ¬; Part: LM2831; QTY: 1000; Price: 7.0434; OPN_JLC: OPN_JLC; SN_JLC: SN_JLC; Price_JLC: 0
footprint SOT23-5 (SOT23, 5-Leads, Body 2.9x1.6mm, Pitch 0.95mm, Lead Span 2.7mm, IPC Low Density)
pins: 1 SW (out), 2 GND (power), 3 FB (in), 4 EN (in), 5 VIN (in)
text: 0.6V

## IC_LM2903D
designator IC?, comment LM2903
±È½ÏÆ÷£¬2P£¬Io=7mA£¬OC; Manufacturer: TI; Quality: -40~125¡æ; Value: 2V~30V;OC; pro-environment: RoHS; SN: 03.4.11.15.83290301S; other: Io=7mA;Tr=300ns; OPN: LM2903D; PadsNum: 0; Category: ¼¯³ÉÐ¾Æ¬; Part: LM2903; QTY: 75; Price: 1.3689; OPN_JLC: OPN_JLC; SN_JLC: SN_JLC; Price_JLC: 0
footprint SO-8 (SOIC, 8-Leads, Body 4.9x3.9mm, Pitch 1.27mm, IPC Low Density)
part A pins: 1 OUT (oc), 2 IN- (in), 3 IN+ (in), 4 GND (power), 8 VCC (power)
part B pins: 5 IN+ (in), 6 IN- (in), 7 OUT (oc)
part A text: Vcc; OC; Gnd
part B text: OC

## IC_LM2937IMP-5.0/NOPB
designator IC?, comment LM2937-5.0
ÎÈÑ¹Ð¾Æ¬,LDO,5.0V/0.5A; Manufacturer: TI; pro-environment: RoHS; Quality: -40~125¡æ; SN: 03.4.11.13.57IM5001S; Value: 5.0V,0.5A; OPN: LM2937IMP-5.0/NOPB; PadsNum: 0; Category: ¼¯³ÉÐ¾Æ¬; Part: LM2937-5.0; QTY: 1000; Price: 7.02; OPN_JLC: OPN_JLC; SN_JLC: SN_JLC; Price_JLC: 0
footprint SOT223-4 (SOT223, 4-Leads, Body 6.5x3.5mm, Pitch 2.3mm, Lead Span 7mm, IPC Low Density)
pins: 1 Vin, 2 GND (power), 3 Vout, 4 GND (power)

## IC_LM5106MM/NOPB
designator IC?, comment LM5106MM
MOSFETÇý¶¯; 1.8A; 8~14V; °ëÇÅÇý¶¯; Manufacturer: IR; Quality: -40~125¡æ; Value: 1.8A,8~14V; pro-environment: RoHS; SN: 03.4.11.20.84210201S; OPN: LM5106MM/NOPB; PadsNum: 0; Category: ¼¯³ÉÐ¾Æ¬; Part: LM5106MM; QTY: 1000; Price: 6.0021; OPN_JLC: OPN_JLC; SN_JLC: SN_JLC; Price_JLC: 0
footprint SO-8 (SOIC, 8-Leads, Body 4.9x3.9mm, Pitch 1.27mm, IPC Low Density)
pins: 1 VDD (power), 2 HB, 3 HO (out), 4 HS, 5 NC, 6 RDT, 7 EN (power), 8 IN (power), 9 VSS (power), 10 LO (out)

## IC_LM6132AIM/NOPB
designator IC?, comment LM6132
OPA; 2P; Io=4mA; Manufacturer: TI; Quality: -40~85¡æ; Value: 1.8V~24V;; pro-environment: RoHS; SN: 03.4.11.15.84613201S; other: Io=4mA;SR=14V/us; OPN: LM6132AIM/NOPB; PadsNum: 0; Category: ¼¯³ÉÐ¾Æ¬; Part: LM6132; QTY: 98; Price: ?; OPN_JLC: OPN_JLC; SN_JLC: SN_JLC; Price_JLC: 0
footprint SO-8 (SOIC, 8-Leads, Body 4.9x3.9mm, Pitch 1.27mm, IPC Low Density)
part A pins: 1 OUTA (out), 2 INA- (in), 3 INA+ (in), 4 VEE (power), 8 VCC (power)
part B pins: 5 INB+ (in), 6 INB- (in), 7 OUTB (out)
part A text: Vcc; Vee

## IC_LM7805CT
designator IC?, comment LM7805
ÎÈÑ¹Ð¾Æ¬, LDO, Êä³öµçÁ÷1A; Manufacturer: ON; pro-environment: RoHS; Quality: 0~70¡æ; Value: 5V,1A; OPN: LM7805CT; PadsNum: 0; SN: SN; Category: ¼¯³ÉÐ¾Æ¬; Part: LM7805; QTY: 50; Price: 6.435; OPN_JLC: OPN_JLC; SN_JLC: SN_JLC; Price_JLC: 0
footprint TO220-3 (TO, Thru-Hole, Vertical, Heatsink Mounted; 3 In-Line Leads; Pitch 2.54 mm)
pins: 0 GND (power), 1 Vin, 2 GND (power), 3 Vout

## IC_LM7809CT
designator IC?, comment LM7809
ÎÈÑ¹Ð¾Æ¬, LDO, 5V, Êä³öµçÁ÷1A; Manufacturer: ON; pro-environment: RoHS; Quality: -40~125¡æ; Value: 9V,1A; OPN: LM7809CT; PadsNum: 0; SN: SN; Category: ¼¯³ÉÐ¾Æ¬; Part: LM7809; QTY: 50; Price: 2.7612; OPN_JLC: OPN_JLC; SN_JLC: SN_JLC; Price_JLC: 0
footprint TO220-3 (TO, Thru-Hole, Vertical, Heatsink Mounted; 3 In-Line Leads; Pitch 2.54 mm)
pins: 0 GND (power), 1 Vin, 2 GND (power), 3 Vout

## IC_LM22674MRE-5.0/NOPB
designator IC?
ÎÈÑ¹Ð¾Æ¬; ¿ª¹ØÐÍ; Êä³öµçÁ÷0.5A; Manufacturer: TI; Quality: -40~125¡æ; Value: 8V-40V,0.5A; Pro-environment: RoHS; PadsNum: 0; Category: ¼¯³ÉÐ¾Æ¬; OPN: LM22674MRE-5.0/NOPB; Other: 8V-40V,0.5A; Part: LM22674MRE-5.0/NOPB; QTY: 250; SN: SN; Price: ?; OPN_JLC: OPN_JLC; SN_JLC: SN_JLC; Price_JLC: 0
footprint SO-8_HT (SOIC, 8-Leads, Body 4.9x3.9mm, Pitch 1.27mm, IPC Low Density)
pins: 1 BOOT (in), 2 NC, 3 NC, 4 FB (in), 5 EN (in), 6 GND (power), 7 VIN (in), 8 SW (power), 9 EP (power)
text: 1.285V

## IC_LM22677TJE-ADJ/NOPB
designator IC?, comment LM22677
ÎÈÑ¹Ð¾Æ¬; ¿ª¹ØÐÍ; Êä³öµçÁ÷5A; Manufacturer: TI; pro-environment: RoHS; Quality: -40~125¡æ; SN: 03.4.11.13.63267701S; Value: 42V,5A; OPN: LM22677TJE-ADJ/NOPB; other: Vin=4.5V~42V,Vout>=1.285 V;Iout=5A; PadsNum: 0; Category: ¼¯³ÉÐ¾Æ¬; Part: LM22677; QTY: 250; Price: ?; OPN_JLC: OPN_JLC; SN_JLC: SN_JLC; Price_JLC: 0
footprint TO263-7 (D2-PAK, 8-Leads, Body 9.9x10.2mm, Pitch 1.27mm, Lead Span 14mm, IPC Low Density)
pins: 1 SW (out), 2 VIN (in), 3 BOOT (in), 4 GND (power), 5 RT/SYNC (in), 6 FB (in), 7 EN (in), 8 EP (power)
text: 1.285V

## IC_LT1006S8#PBF-ND
designator IC?, comment LT1006
¹¦ÂÊÔË·Å; Io=5A; 20~70V; Manufacturer: ADI; Quality: -40~85¡æ; Value: 5V~30V; pro-environment: RoHS; other: Io=5A;SR=10V/us; OPN: LT1006S8#PBF-ND; PadsNum: 0; SN: SN; Category: ¼¯³ÉÐ¾Æ¬; Part: LT1006; QTY: 25; Price: 24.21560; OPN_JLC: OPN_JLC; SN_JLC: SN_JLC; Price_JLC: 0
footprint SO-8_W (8-Pin Small Outline Package 1.27 mm Pitch, IPC Low Density)
pins: 1 TRIM, 2 IN- (in), 3 IN+ (in), 4 V- (power), 5 TRIM, 6 OUT (out), 7 +V (power), 8 Iset (in)
text: Vcc; Vee; 1, 5
